# Altium footprint library XU-GENARAL PCB .PcbLib: 1176 footprints (part 17 of 75)
Each footprint in its own frame and in the unit in brackets; x right, y up, seen from the top. Pads: shape width x height; smd on the part's side, far side on the other; paste and mask are expansions set on the pad; w line width, h text height; cw(c..) or ccw(c..) is an arc to the next point about the centre after c.
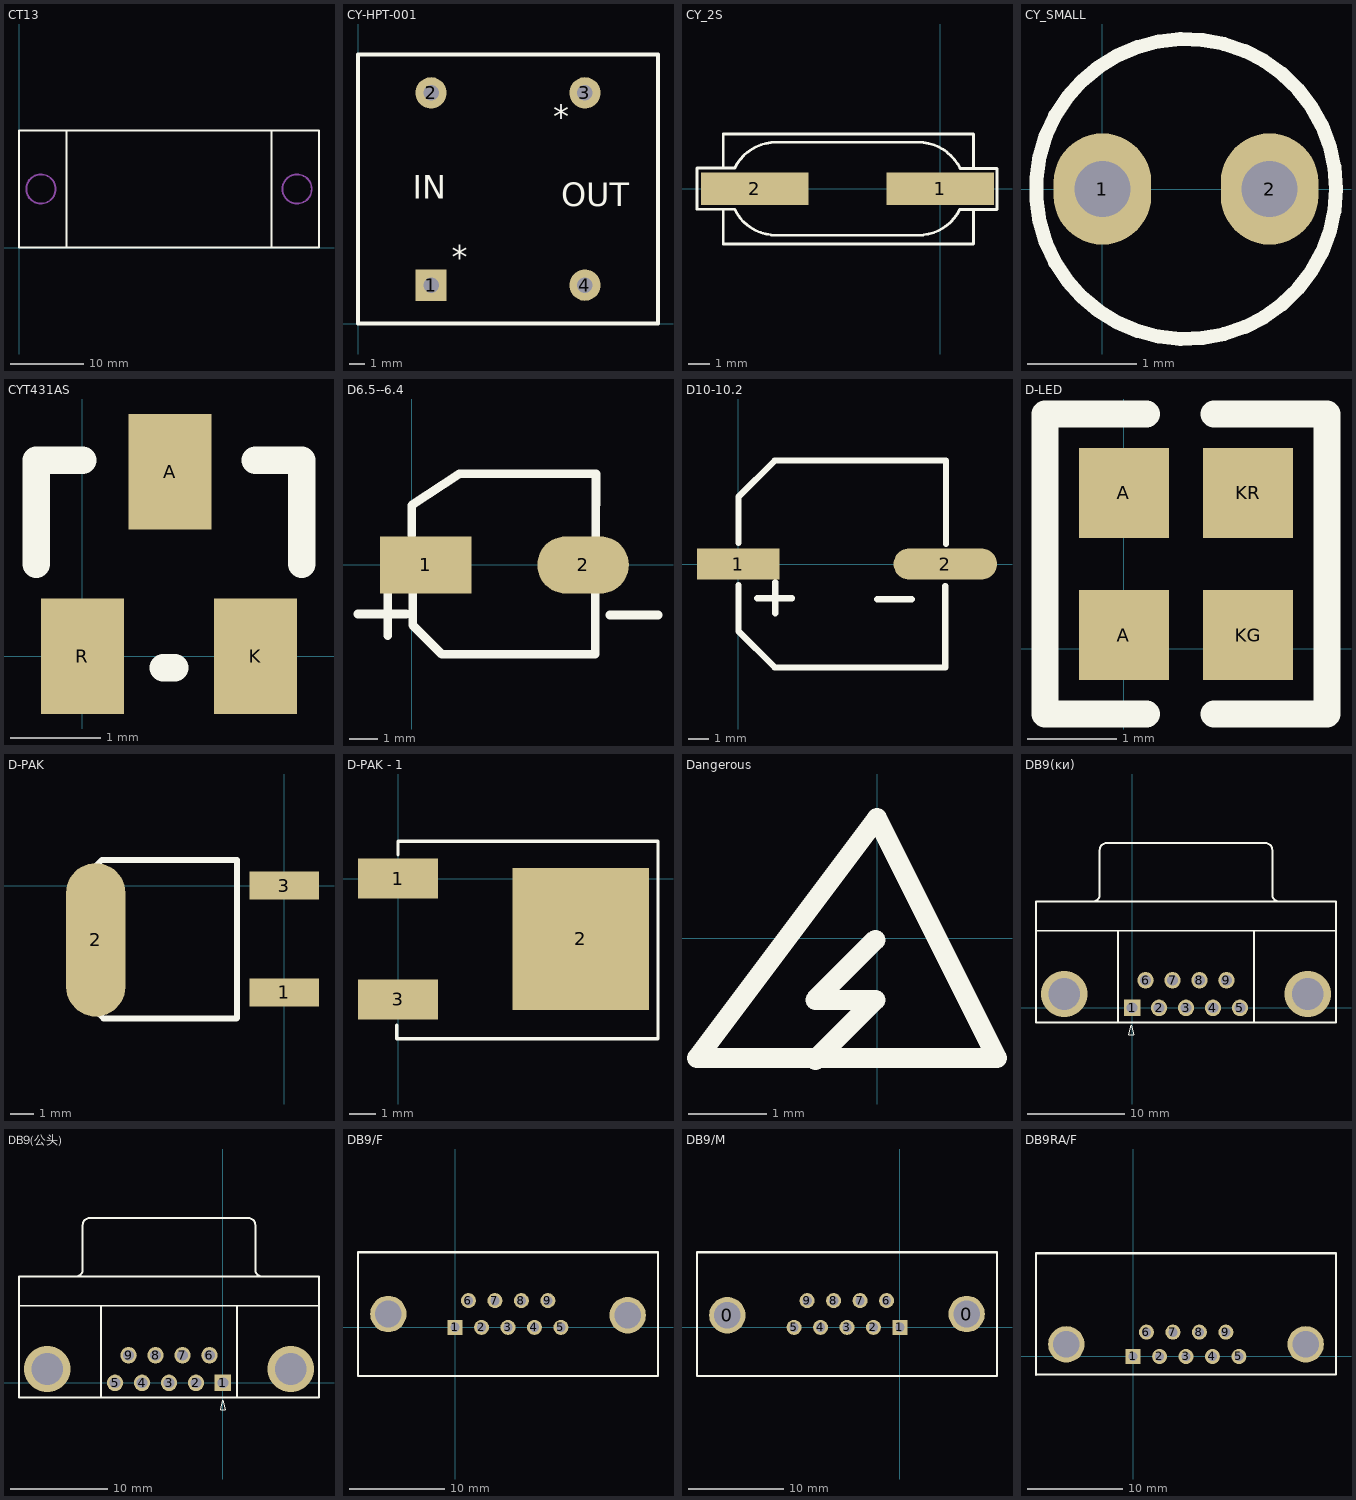
[diagram p16: the footprints below, top view; thin cyan lines are the x and y axes]

## CT13 [mil]
Top Overlay:
  lines w10: 255.91,0 255.91,629.92 ; 1358.27,0 1358.27,629.92 ; 0,0 0,629.92 1614.17,629.92 1614.17,0 0,0
Mechanical 1:
  circle w10: c1496.06,314.96 r78.74
  circle w10: c118.11,314.96 r78.74

## CY-HPT-001 [mil]
pads (4):
  rect 80x80 hole 40: 1(187.01,98.42)
  round 80 hole 40: 2(187.01,590.55) 3(580.71,590.55) 4(580.71,98.42)
Top Overlay:
  lines w10: 0,0 0,688.98 767.72,688.98 767.72,0 0,0
  text "*" at 240,140 h60
  text "*" at 500,500 h60
  text "OUT" at 520,300 h60
  text "IN" at 140,320 h60

## CY_2S [mm]
pads (2):
  rect 5x1.5 smd: 1(0,0) 2(-8.611,0)
Top Overlay:
  lines w0.127: -10.084,-0.955 -10.084,-2.565 1.549,-2.565 1.549,-0.966 ; -10.084,0.966 -10.084,2.54 1.549,2.54 1.549,0.945 ; -11.303,-0.955 -11.303,0.966 -10.744,0.966 -10.641,0.966 -9.551,0.966 cw(c-7.62,0) -7.62,2.159 -1.016,2.159 cw(c-1.016,0) 0.925,0.945 2.108,0.945 2.642,0.945 2.642,-0.966 2.108,-0.966 0.915,-0.966 cw(c-1.016,0) -1.016,-2.159 -7.62,-2.159 cw(c-7.62,0) -9.556,-0.955 -10.641,-0.955 -10.744,-0.955 -11.303,-0.955

## CY_SMALL [mil]
pads (2):
  oval 35x40 hole 20: 1(0,0) 2(60,0)
Top Overlay:
  circle w5: c30,0 r53.85

## CYT431AS [mil]
pads (3):
  rect 36x50 smd: A(38,80) K(75,0) R(0,0)
Top Overlay:
  lines w12: -20,40 -20,85 0,85 ; 35,-5 40,-5 ; 75,85 95,85 95,40

## D6.5--6.4 [mm]
pads (2):
  rect 3.2x2 smd: 1(0.5,-0.01)
  oval 3.2x2 smd: 2(5.998,-0.013)
Top Overlay:
  lines w0.305: -1.871,-1.725 -0.195,-1.725 ; -0.827,-2.49 -0.827,-0.991 ; 0.008,1.023 0.005,2.08 1.671,3.175 6.448,3.171 6.444,0.911 ; 0.044,-0.989 0.044,-2.124 1.052,-3.132 6.423,-3.132 6.423,-0.948 ; 6.94,-1.758 8.616,-1.758

## D10-10.2 [mm]
pads (2):
  rect 4x1.5 smd: 1(0.003,0.003)
  oval 5x1.5 smd: 2(10.008,0.007)
Top Overlay:
  lines w0.3: 0.008,1.785 0.008,3.257
  lines w0.305: 0.008,-2.493 0.008,-1.009 ; 0.008,-2 0.008,-3.243 1.758,-4.993 3.008,-4.993 10.008,-4.993 10.008,-1.06 ; 0.008,1.023 0.008,2.507 ; 0.008,3.257 1.758,5.007 3.008,5.007 10.008,5.007 ; 0.923,-1.644 2.599,-1.644 ; 1.786,-2.381 1.786,-0.882 ; 6.714,-1.695 8.39,-1.695 ; 10.038,5.007 10.041,0.972

## D-LED [mil]
pads (4):
  rect 40x40 smd: A(0,6) A(0,69) KG(55,6) KR(55,69)
Top Overlay:
  lines w12: -35,34 -35,104 10,104 ; -35,41 -35,-29 10,-29 ; 40,-29 90,-29 90,41 ; 40,104 90,104 90,34

## D-PAK [mm]
pads (3):
  rect 3x1.2 smd: 1(0,-4.6) 3(0,0)
  oval 2.54x6.604 smd: 2(-8.103,-2.337)
Top Overlay:
  lines w0.254: -8.103,-5.385 -7.767,-5.72 -6.629,-5.72 ; -8.103,0.838 -7.841,1.1 -7.222,1.1 -2.022,1.1 -2.022,-2.3 -2.022,-5.7 ; -7.222,-5.72 -2.042,-5.72

## D-PAK - 1 [mil]
height 267.72
pads (3):
  rect 120x60 smd: 1(0,0) 3(0,-181.1)
  rect 204.72x212.6 smd: 2(274,-90.55)
Top Overlay:
  lines w5: -2,-220 -2,-240 390,-240 390,-218 390,56 0,56 0,36

## Dangerous [mil]
Top Overlay:
  lines w10: -30.83,-60.83 -0.83,-30.83 -30.83,-30.83 -0.83,-0.83 ; -90,-60 0,60 60,-60 -90,-60

## DB9(ĸͷ) [mm]
pads (9):
  rect 1.69x1.69 hole 1.09: 1(0,0)
  round 1.69 hole 1.09: 2(2.77,0) 3(5.54,0) 4(8.31,0) 5(11.08,0) 6(1.385,2.84) 7(4.155,2.84) 8(6.925,2.84) 9(9.695,2.84)
via -6.955,1.42 diameter 4.76 hole 3.26
via 18.035,1.42 diameter 4.76 hole 3.26
Top Overlay:
  lines w0.127: -0.346,-2.778 0.154,-2.778 -0.096,-1.778 -0.346,-2.778
  lines w0.2: -9.86,7.92 20.94,7.92 ; -4.02,10.925 ccw(c-4.02,11.62) -3.325,11.62 -3.325,16.22 ; -3.32,16.225 cw(c-2.625,16.225) -2.625,16.92 13.705,16.92 cw(c13.705,16.225) 14.4,16.225 ; -1.46,-1.48 -1.46,7.92 ; 12.54,-1.48 12.54,7.92 ; 14.405,16.22 14.405,11.62 ccw(c15.1,11.62) 15.1,10.925 ; -9.86,-1.48 20.94,-1.48 20.94,10.92 -9.86,10.92 -9.86,-1.48

## DB9(公头) [mm]
pads (9):
  rect 1.69x1.69 hole 1.09: 1(0,0)
  round 1.69 hole 1.09: 2(-2.77,0) 3(-5.54,0) 4(-8.31,0) 5(-11.08,0) 6(-1.385,2.84) 7(-4.155,2.84) 8(-6.925,2.84) 9(-9.695,2.84)
via -18.035,1.42 diameter 4.76 hole 3.26
via 6.955,1.42 diameter 4.76 hole 3.26
Top Overlay:
  lines w0.127: -0.25,-2.778 0,-1.778 0.25,-2.778 -0.25,-2.778
  lines w0.2: -20.94,7.92 9.86,7.92 ; -15.1,10.925 ccw(c-15.1,11.62) -14.405,11.62 -14.405,16.22 ; -14.4,16.225 cw(c-13.705,16.225) -13.705,16.92 2.625,16.92 cw(c2.625,16.225) 3.32,16.225 ; -12.54,-1.48 -12.54,7.92 ; 1.46,-1.48 1.46,7.92 ; 3.325,16.22 3.325,11.62 ccw(c4.02,11.62) 4.02,10.925 ; -20.94,-1.48 9.86,-1.48 9.86,10.92 -20.94,10.92 -20.94,-1.48

## DB9/F [mil]
pads (11):
  rect 62x62 hole 38: 1(0,0)
  round 62 hole 38: 2(109,0) 3(218,0) 4(327,0) 5(436,0) 6(55,110) 7(164,110) 8(273,110) 9(382,110)
  round 150 hole 110: ""(-275,55) ""(711,50)
Top Overlay:
  lines w8: -400,-200 836,-200 836,310
  lines w10: -400,-200 -400,310 836,310

## DB9/M [mil]
pads (11):
  round 150 hole 110: 0(-711,50) 0(275,55)
  rect 62x62 hole 38: 1(0,0)
  round 62 hole 38: 2(-109,0) 3(-218,0) 4(-327,0) 5(-436,0) 6(-55,110) 7(-164,110) 8(-273,110) 9(-382,110)
Top Overlay:
  lines w8: -836,310 -836,-200 400,-200
  lines w10: -836,310 400,310 400,-200

## DB9RA/F [mil]
pads (11):
  rect 62x62 hole 38: 1(0,0)
  round 62 hole 38: 2(109,0) 3(218,0) 4(327,0) 5(436,0) 6(55,100) 7(164,100) 8(273,100) 9(382,100)
  round 150 hole 110: ""(-275,50) ""(711,50)
Top Overlay:
  lines w8: -400,-75 836,-75 836,425
  lines w10: -400,-75 -400,425 836,425